# Altium footprint library LDCN Components.PcbLib: 426 footprints (part 16 of 27)
Each footprint in its own frame and in the unit in brackets; x right, y up, seen from the top. Pads: shape width x height; smd on the part's side, far side on the other; paste and mask are expansions set on the pad; w line width, h text height; cw(c..) or ccw(c..) is an arc to the next point about the centre after c.
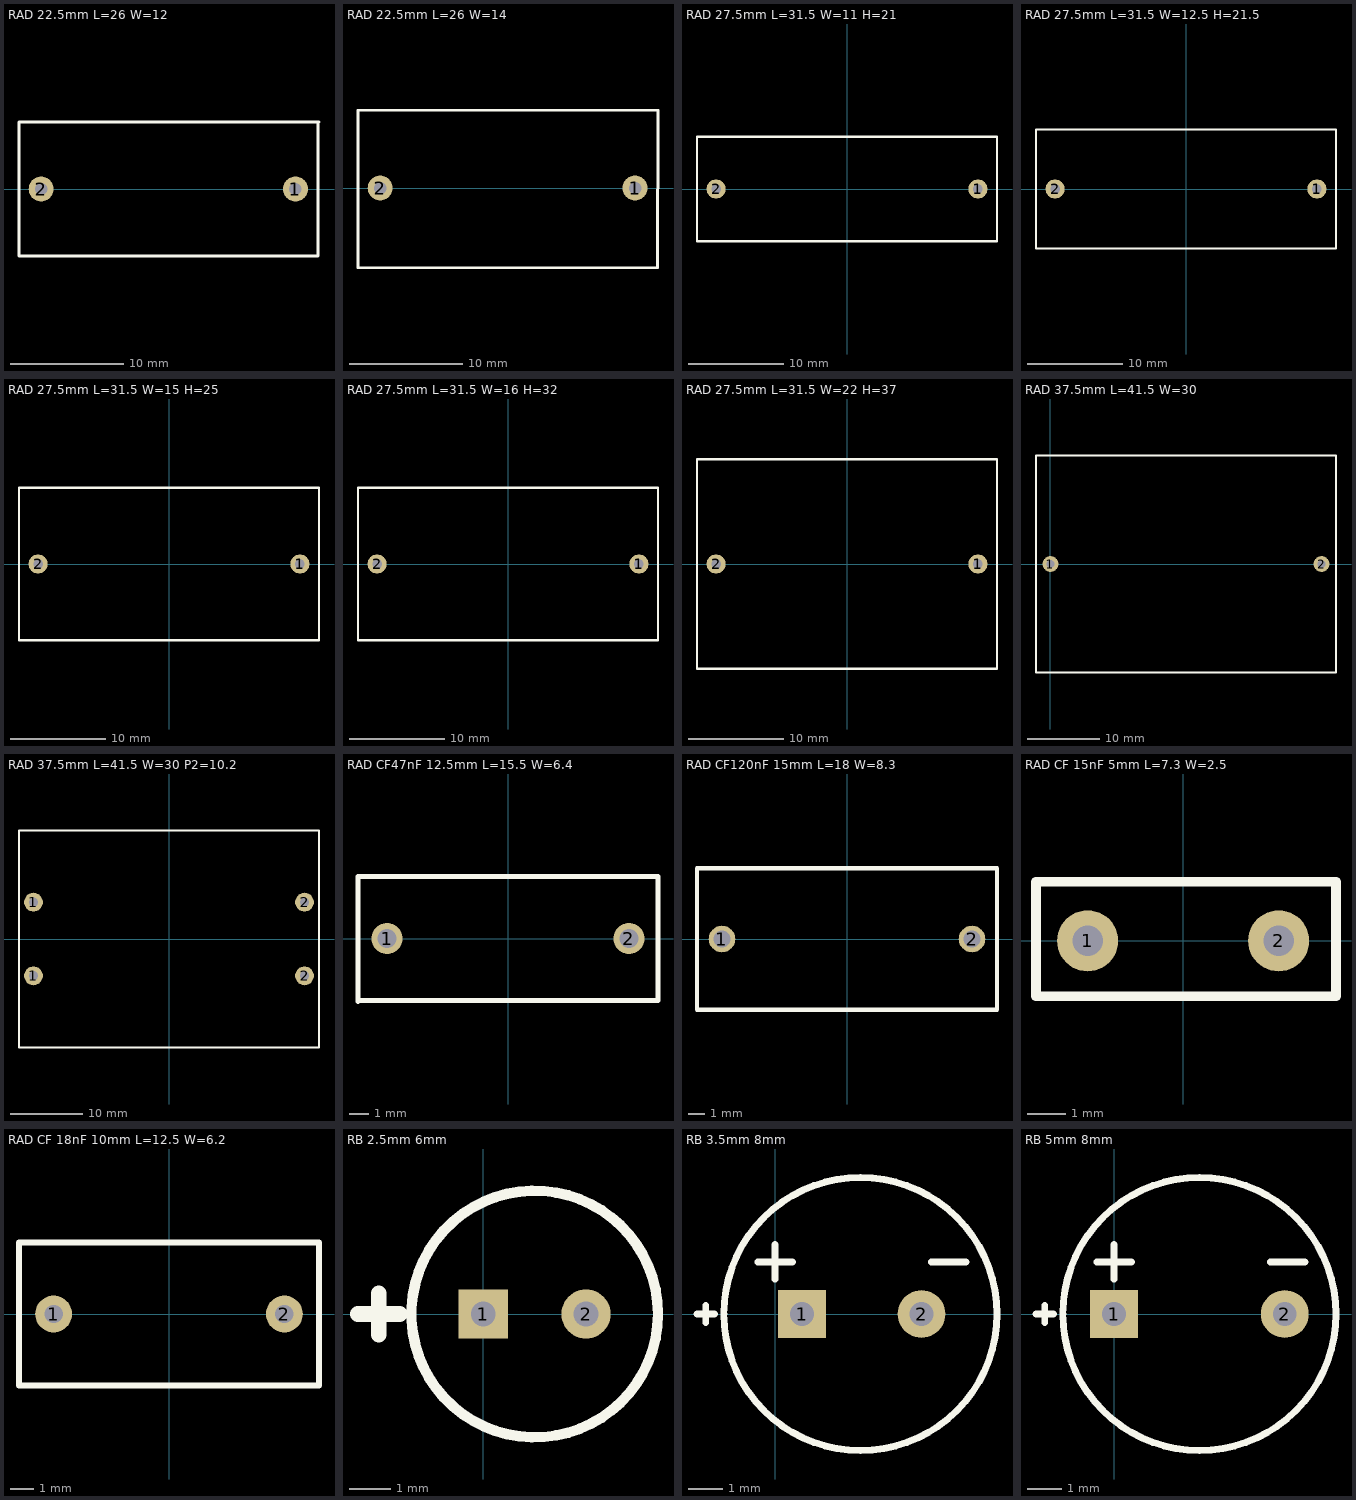
[diagram p15: the footprints below, top view; thin cyan lines are the x and y axes]

## RAD 22.5mm L=26 W=12 [mm] "BC MKP 338"
height 22
pads (2):
  round 2.2 hole 1.1: 1(-6,0) 2(-28.448,0)
Top Overlay:
  lines w0.254: -4,5.9 -4,-5.9 -30.4,-5.9 -30.4,5.9 -3.92,5.9

## RAD 22.5mm L=26 W=14 [mm] "BC MKT 468"
height 28
pads (2):
  round 2.2 hole 1.1: 1(-6,0) 2(-28.448,0)
Top Overlay:
  lines w0.254: -30.4,6.85 -30.4,-7.025 -4,-7.025 ; -30.375,6.85 -3.975,6.85 -4.002,-7.025

## RAD 27.5mm L=31.5 W=11 H=21 [mm] "1mm hole for 0.8mm pin"
height 21
pads (2):
  round 2 hole 1: 1(13.75,0) 2(-13.75,0)
Top Overlay:
  lines w0.254: -15.75,-5.5 15.75,-5.5 15.75,5.5 -15.75,5.5 -15.75,-5.5

## RAD 27.5mm L=31.5 W=12.5 H=21.5 [mm] "1mm hole for 0.8mm pin"
height 22
pads (2):
  round 2 hole 1: 1(13.75,0) 2(-13.75,0)
Top Overlay:
  lines w0.254: -15.75,-6.25 15.75,-6.25 15.75,6.25 -15.75,6.25 -15.75,-6.25

## RAD 27.5mm L=31.5 W=15 H=25 [mm] "1mm hole for 0.8mm pin"
height 25
pads (2):
  round 2 hole 1: 1(13.75,0) 2(-13.75,0)
Top Overlay:
  lines w0.254: -15.75,-8 15.75,-8 15.75,8 -15.75,8 -15.75,-8

## RAD 27.5mm L=31.5 W=16 H=32 [mm] "1mm hole for 0.8mm pin"
height 32
pads (2):
  round 2 hole 1: 1(13.75,0) 2(-13.75,0)
Top Overlay:
  lines w0.254: -15.75,-8 -15.75,8 15.75,8 15.75,-8 -15.75,-8

## RAD 27.5mm L=31.5 W=22 H=37 [mm] "1mm hole for 0.8mm pin"
height 37
pads (2):
  round 2 hole 1: 1(13.75,0) 2(-13.75,0)
Top Overlay:
  lines w0.254: -15.75,-11 15.75,-11 15.75,11 -15.75,11 -15.75,-11

## RAD 37.5mm L=41.5 W=30 [mm] "JSP 470uF Cap"
height 44
pads (2):
  round 2.2 hole 1.1: 1(0,0) 2(37.5,0)
Top Overlay:
  lines w0.254: -2,-15 39.5,-15 39.5,15 -2,15 -2,0 -2,-15

## RAD 37.5mm L=41.5 W=30 P2=10.2 [mm] "Panasonic EZPE50456MTA (1.2mm Lead)"
height 51
pads (4):
  round 2.6 hole 1.3: 1(-18.75,-5.1) 1(-18.75,5.1) 2(18.75,-5.1) 2(18.75,5.1)
Top Overlay:
  lines w0.254: -20.75,-15 20.75,-15 20.75,15 -20.75,15 -20.75,0 -20.75,-15

## RAD CF47nF 12.5mm L=15.5 W=6.4 [mm] "1mm Hole"
height 12.3
pads (2):
  round 1.6 hole 1: 1(-6.25,0) 2(6.25,0)
Top Overlay:
  lines w0.254: -7.75,-3.25 -7.75,3.2 7.75,3.2 7.75,-3.2 -7.75,-3.2

## RAD CF120nF 15mm L=18 W=8.3 [mm] "1mm Hole"
height 14.2
pads (2):
  round 1.6 hole 1: 1(-7.5,0) 2(7.5,0)
Top Overlay:
  lines w0.254: -9,-4.25 -9,4.25 9,4.25 9,-4.25 -9,-4.25

## RAD CF 15nF 5mm L=7.3 W=2.5 [mm] "0.8mm Hole"
height 10.6
pads (2):
  round 1.6 hole 0.8: 1(-2.5,0) 2(2.5,0)
Top Overlay:
  lines w0.254: -3.85,-1.45 -3.85,1.55 -3.25,1.55 3.25,1.55 4,1.55 4,-1.45 -3.85,-1.45

## RAD CF 18nF 10mm L=12.5 W=6.2 [mm] "0.8mm Hole"
height 10.6
pads (2):
  round 1.6 hole 0.8: 1(-5,0) 2(5,0)
Top Overlay:
  lines w0.254: -6.5,-3.1 -6.5,3.1 6.5,3.1 6.5,-3.1 -6.5,-3.1

## RB 2.5mm 6mm [mm] "0.5mm Diameter Leads"
height 11
pads (2):
  rect 1.2x1.2 hole 0.6: 1(0,0)
  round 1.2 hole 0.6: 2(2.5,0)
Top Overlay:
  circle w0.254: c1.25,0 r3
  lines w0.381: -3.048,0 -2.032,0 ; -2.54,-0.508 -2.54,0.508

## RB 3.5mm 8mm [mm] "0.6mm Leads"
height 12
pads (2):
  rect 1.4x1.4 hole 0.7: 1(0.79,0)
  round 1.4 hole 0.7: 2(4.29,0)
Top Overlay:
  circle w0.2: c2.5,0 r4
  lines w0.2: -2.286,0 -1.778,0 ; -2.032,-0.254 -2.032,0.254 ; -0.508,1.524 0.508,1.524 ; 0,1.016 0,2.032 ; 4.572,1.524 5.588,1.524

## RB 5mm 8mm [mm]
height 20
pads (2):
  rect 1.4x1.4 hole 0.7: 1(0,0)
  round 1.4 hole 0.7: 2(5,0)
Top Overlay:
  circle w0.2: c2.5,0 r4
  lines w0.2: -2.286,0 -1.778,0 ; -2.032,-0.254 -2.032,0.254 ; -0.508,1.524 0.508,1.524 ; 0,1.016 0,2.032 ; 4.572,1.524 5.588,1.524